# Altium footprint library ref-packages-longpad.PCBLIB: 1527 footprints (part 63 of 103)
Each footprint in its own frame and in the unit in brackets; x right, y up, seen from the top. Pads: shape width x height; smd on the part's side, far side on the other; paste and mask are expansions set on the pad; w line width, h text height; cw(c..) or ccw(c..) is an arc to the next point about the centre after c.
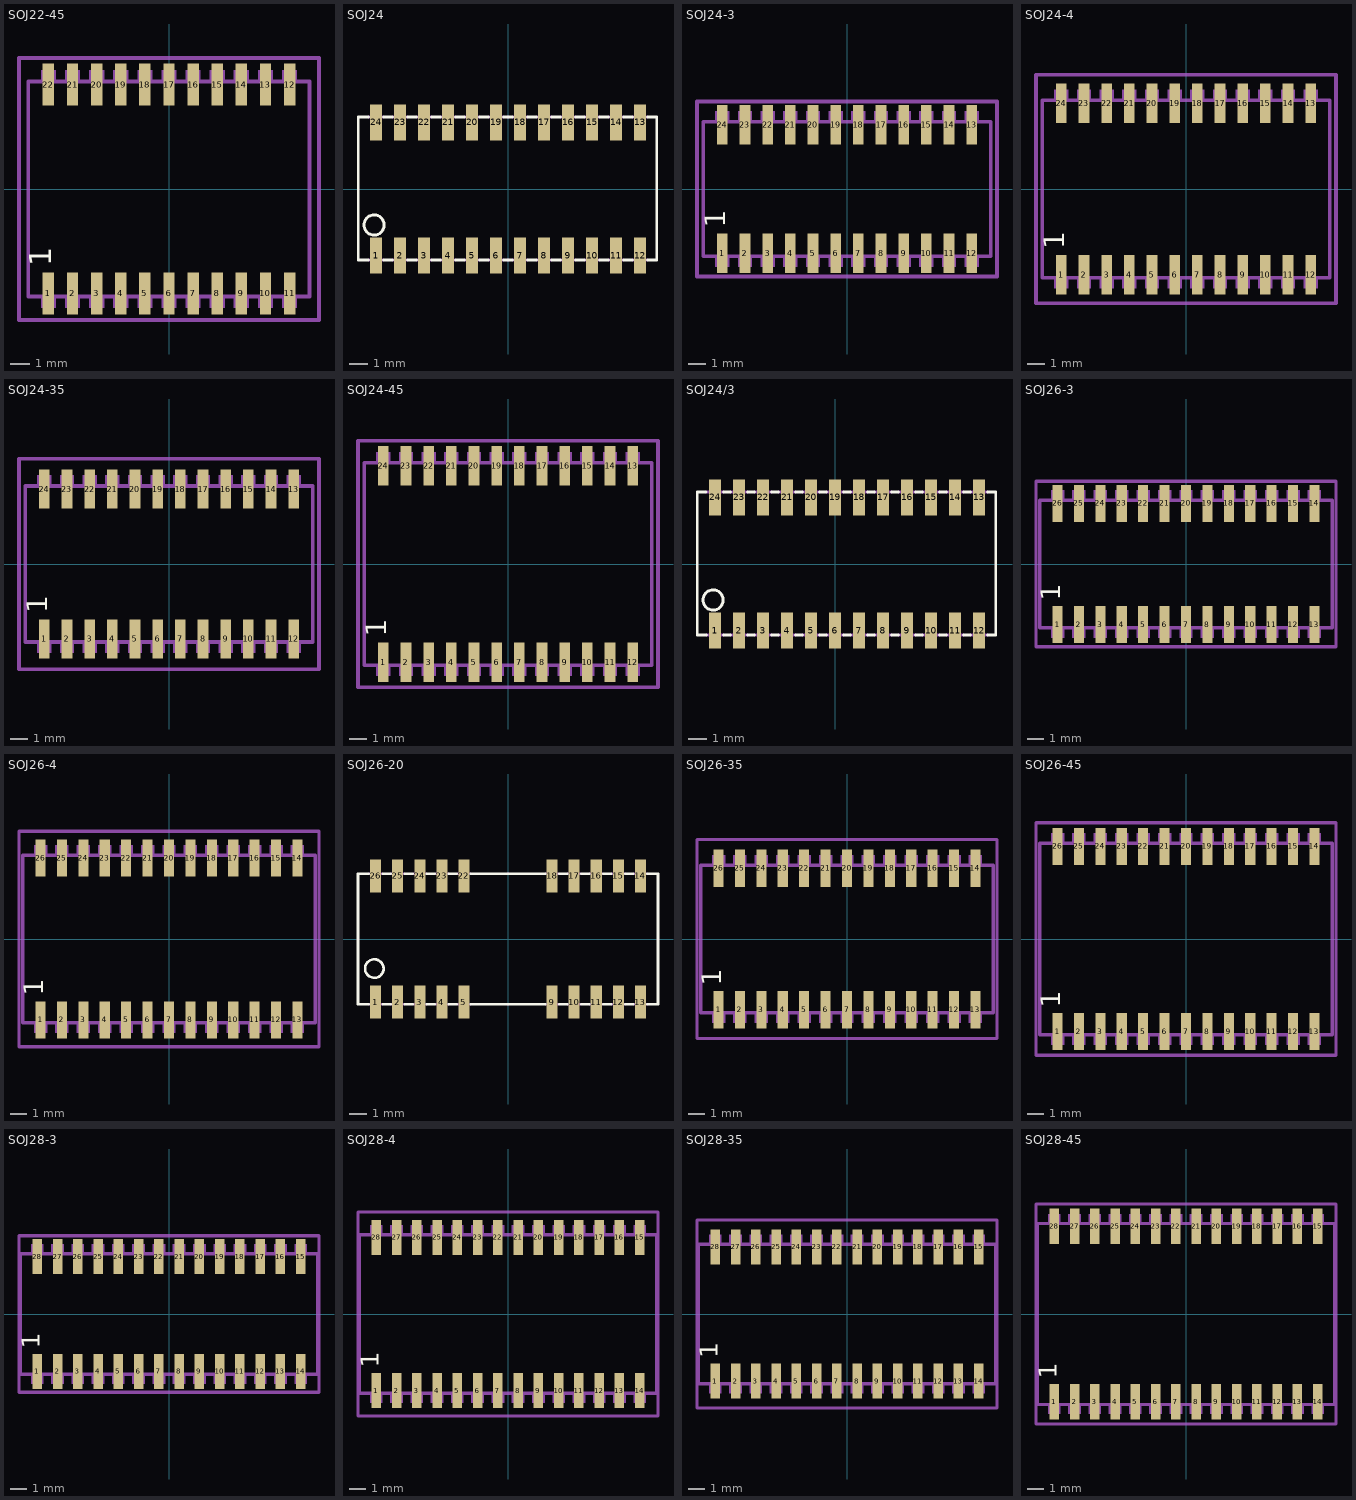
[diagram p62: the footprints below, top view; thin cyan lines are the x and y axes]

## SOJ22-45 [mil]
pads (22):
  rect 23.62x86.61 smd: 1(-250,-216.54) 2(-200,-216.54) 3(-150,-216.54) 4(-100,-216.54) 5(-50,-216.54) 6(0,-216.54) 7(50,-216.54) 8(100,-216.54) 9(150,-216.54) 10(200,-216.54) 11(250,-216.54) 12(250,216.54) 13(200,216.54) 14(150,216.54) 15(100,216.54) 16(50,216.54) 17(0,216.54) 18(-50,216.54) 19(-100,216.54) 20(-150,216.54) 21(-200,216.54) 22(-250,216.54)
Top Overlay:
  text "1" at -228.54,-160.24 h77.5
Mechanical 16:
  rectangle: -259.84,-219.29 -240.16,-174.41
  rectangle: -265.75,-247.24 -234.25,-227.17
  rectangle: -209.84,-219.29 -190.16,-174.41
  rectangle: -215.75,-247.24 -184.25,-227.17
  rectangle: -159.84,-219.29 -140.16,-174.41
  rectangle: -165.75,-247.24 -134.25,-227.17
  rectangle: -109.84,-219.29 -90.16,-174.41
  rectangle: -115.75,-247.24 -84.25,-227.17
  rectangle: -59.84,-219.29 -40.16,-174.41
  rectangle: -65.75,-247.24 -34.25,-227.17
  rectangle: -9.84,-219.29 9.84,-174.41
  rectangle: -15.75,-247.24 15.75,-227.17
  rectangle: 40.16,-219.29 59.84,-174.41
  rectangle: 34.25,-247.24 65.75,-227.17
  rectangle: 90.16,-219.29 109.84,-174.41
  rectangle: 84.25,-247.24 115.75,-227.17
  rectangle: 140.16,-219.29 159.84,-174.41
  rectangle: 134.25,-247.24 165.75,-227.17
  rectangle: 190.16,-219.29 209.84,-174.41
  rectangle: 184.25,-247.24 215.75,-227.17
  rectangle: 240.16,-219.29 259.84,-174.41
  rectangle: 234.25,-247.24 265.75,-227.17
  rectangle: 240.16,174.41 259.84,219.29
  rectangle: 234.25,227.17 265.75,247.24
  rectangle: 190.16,174.41 209.84,219.29
  rectangle: 184.25,227.17 215.75,247.24
  rectangle: 140.16,174.41 159.84,219.29
  rectangle: 134.25,227.17 165.75,247.24
  rectangle: 90.16,174.41 109.84,219.29
  rectangle: 84.25,227.17 115.75,247.24
  rectangle: 40.16,174.41 59.84,219.29
  rectangle: 34.25,227.17 65.75,247.24
  rectangle: -9.84,174.41 9.84,219.29
  rectangle: -15.75,227.17 15.75,247.24
  rectangle: -59.84,174.41 -40.16,219.29
  rectangle: -65.75,227.17 -34.25,247.24
  rectangle: -109.84,174.41 -90.16,219.29
  rectangle: -115.75,227.17 -84.25,247.24
  rectangle: -159.84,174.41 -140.16,219.29
  rectangle: -165.75,227.17 -134.25,247.24
  rectangle: -209.84,174.41 -190.16,219.29
  rectangle: -215.75,227.17 -184.25,247.24
  rectangle: -259.84,174.41 -240.16,219.29
  rectangle: -265.75,227.17 -234.25,247.24
  lines w8: -291.93,-223.23 291.54,-223.23 291.54,223.23 -291.93,223.23 -291.93,-223.23
Mechanical 27:
  lines w7.87: -311.02,-271.65 -311.02,271.65 311.02,271.65 311.02,-271.65 -311.02,-271.65

## SOJ24 [mil]
pads (24):
  rect 25x75 smd: 1(-275,-139) 2(-225,-139) 3(-175,-139) 4(-125,-139) 5(-75,-139) 6(-25,-139) 7(25,-139) 8(75,-139) 9(125,-139) 10(175,-139) 11(225,-139) 12(275,-139) 13(275,139) 14(225,139) 15(175,139) 16(125,139) 17(75,139) 18(25,139) 19(-25,139) 20(-75,139) 21(-125,139) 22(-175,139) 23(-225,139) 24(-275,139)
Top Overlay:
  circle w6: c-279,-75 r21
  lines w6: -291,-148 -312,-148 -312,150 -291,150 ; -259,-148 -241,-148 ; -259,150 -241,150 ; -209,-148 -191,-148 ; -209,150 -191,150 ; -159,-148 -141,-148 ; -159,150 -141,150 ; -109,-148 -91,-148 ; -109,150 -91,150 ; -59,-148 -41,-148 ; -59,150 -41,150 ; -9,-148 9,-148 ; -9,150 9,150 ; 41,-148 59,-148 ; 41,150 59,150 ; 91,-148 109,-148 ; 91,150 109,150 ; 141,-148 159,-148 ; 141,150 159,150 ; 191,-148 209,-148 ; 191,150 209,150 ; 241,-148 259,-148 ; 241,150 259,150 ; 291,-148 310,-148 310,150 291,150
Mechanical 16:
  rectangle: 265,152 285,172
  rectangle: 268,122 282,152
  rectangle: 215,152 235,172
  rectangle: 218,122 232,152
  rectangle: 165,152 185,172
  rectangle: 168,122 182,152
  rectangle: 115,152 135,172
  rectangle: 118,122 132,152
  rectangle: 65,152 85,172
  rectangle: 68,122 82,152
  rectangle: 15,152 35,172
  rectangle: 18,122 32,152
  rectangle: -35,152 -15,172
  rectangle: -32,122 -18,152
  rectangle: -85,152 -65,172
  rectangle: -82,122 -68,152
  rectangle: -135,152 -115,172
  rectangle: -132,122 -118,152
  rectangle: -185,152 -165,172
  rectangle: -182,122 -168,152
  rectangle: -235,152 -215,172
  rectangle: -232,122 -218,152
  rectangle: -285,152 -265,172
  rectangle: -282,122 -268,152
  rectangle: -285,-170 -265,-150
  rectangle: -282,-150 -268,-120
  rectangle: -235,-170 -215,-150
  rectangle: -232,-150 -218,-120
  rectangle: -185,-170 -165,-150
  rectangle: -182,-150 -168,-120
  rectangle: -135,-170 -115,-150
  rectangle: -132,-150 -118,-120
  rectangle: -85,-170 -65,-150
  rectangle: -82,-150 -68,-120
  rectangle: -35,-170 -15,-150
  rectangle: -32,-150 -18,-120
  rectangle: 15,-170 35,-150
  rectangle: 18,-150 32,-120
  rectangle: 65,-170 85,-150
  rectangle: 68,-150 82,-120
  rectangle: 115,-170 135,-150
  rectangle: 118,-150 132,-120
  rectangle: 165,-170 185,-150
  rectangle: 168,-150 182,-120
  rectangle: 215,-170 235,-150
  rectangle: 218,-150 232,-120
  rectangle: 265,-170 285,-150
  rectangle: 268,-150 282,-120
  lines w6: -290,150 -261,150 ; -289,-148 -261,-148 ; -239,-148 -211,-148 ; -239,150 -211,150 ; -189,-148 -161,-148 ; -189,150 -161,150 ; -139,-148 -111,-148 ; -139,150 -111,150 ; -89,-148 -61,-148 ; -89,150 -61,150 ; -39,-148 -11,-148 ; -39,150 -11,150 ; 11,-148 39,-148 ; 11,150 39,150 ; 61,-148 89,-148 ; 61,150 89,150 ; 111,-148 139,-148 ; 111,150 139,150 ; 161,-148 189,-148 ; 161,150 189,150 ; 211,-148 239,-148 ; 211,150 239,150 ; 261,-148 289,-148 ; 261,150 289,150

## SOJ24-3 [mil]
pads (24):
  rect 23.62x86.61 smd: 1(-275,-141.73) 2(-225,-141.73) 3(-175,-141.73) 4(-125,-141.73) 5(-75,-141.73) 6(-25,-141.73) 7(25,-141.73) 8(75,-141.73) 9(125,-141.73) 10(175,-141.73) 11(225,-141.73) 12(275,-141.73) 13(275,141.73) 14(225,141.73) 15(175,141.73) 16(125,141.73) 17(75,141.73) 18(25,141.73) 19(-25,141.73) 20(-75,141.73) 21(-125,141.73) 22(-175,141.73) 23(-225,141.73) 24(-275,141.73)
Top Overlay:
  text "1" at -253.54,-85.43 h77.5
Mechanical 16:
  rectangle: -284.84,-144.49 -265.16,-99.61
  rectangle: -290.75,-172.44 -259.25,-152.36
  rectangle: -234.84,-144.49 -215.16,-99.61
  rectangle: -240.75,-172.44 -209.25,-152.36
  rectangle: -184.84,-144.49 -165.16,-99.61
  rectangle: -190.75,-172.44 -159.25,-152.36
  rectangle: -134.84,-144.49 -115.16,-99.61
  rectangle: -140.75,-172.44 -109.25,-152.36
  rectangle: -84.84,-144.49 -65.16,-99.61
  rectangle: -90.75,-172.44 -59.25,-152.36
  rectangle: -34.84,-144.49 -15.16,-99.61
  rectangle: -40.75,-172.44 -9.25,-152.36
  rectangle: 15.16,-144.49 34.84,-99.61
  rectangle: 9.25,-172.44 40.75,-152.36
  rectangle: 65.16,-144.49 84.84,-99.61
  rectangle: 59.25,-172.44 90.75,-152.36
  rectangle: 115.16,-144.49 134.84,-99.61
  rectangle: 109.25,-172.44 140.75,-152.36
  rectangle: 165.16,-144.49 184.84,-99.61
  rectangle: 159.25,-172.44 190.75,-152.36
  rectangle: 215.16,-144.49 234.84,-99.61
  rectangle: 209.25,-172.44 240.75,-152.36
  rectangle: 265.16,-144.49 284.84,-99.61
  rectangle: 259.25,-172.44 290.75,-152.36
  rectangle: 265.16,99.61 284.84,144.49
  rectangle: 259.25,152.36 290.75,172.44
  rectangle: 215.16,99.61 234.84,144.49
  rectangle: 209.25,152.36 240.75,172.44
  rectangle: 165.16,99.61 184.84,144.49
  rectangle: 159.25,152.36 190.75,172.44
  rectangle: 115.16,99.61 134.84,144.49
  rectangle: 109.25,152.36 140.75,172.44
  rectangle: 65.16,99.61 84.84,144.49
  rectangle: 59.25,152.36 90.75,172.44
  rectangle: 15.16,99.61 34.84,144.49
  rectangle: 9.25,152.36 40.75,172.44
  rectangle: -34.84,99.61 -15.16,144.49
  rectangle: -40.75,152.36 -9.25,172.44
  rectangle: -84.84,99.61 -65.16,144.49
  rectangle: -90.75,152.36 -59.25,172.44
  rectangle: -134.84,99.61 -115.16,144.49
  rectangle: -140.75,152.36 -109.25,172.44
  rectangle: -184.84,99.61 -165.16,144.49
  rectangle: -190.75,152.36 -159.25,172.44
  rectangle: -234.84,99.61 -215.16,144.49
  rectangle: -240.75,152.36 -209.25,172.44
  rectangle: -284.84,99.61 -265.16,144.49
  rectangle: -290.75,152.36 -259.25,172.44
  lines w8: -316.93,-148.43 316.54,-148.43 316.54,148.43 -316.93,148.43 -316.93,-148.43
Mechanical 27:
  lines w7.87: -330.71,-192.91 -330.71,192.91 330.71,192.91 330.71,-192.91 -330.71,-192.91

## SOJ24-4 [mil]
pads (24):
  rect 23.62x86.61 smd: 1(-275,-188.98) 2(-225,-188.98) 3(-175,-188.98) 4(-125,-188.98) 5(-75,-188.98) 6(-25,-188.98) 7(25,-188.98) 8(75,-188.98) 9(125,-188.98) 10(175,-188.98) 11(225,-188.98) 12(275,-188.98) 13(275,188.98) 14(225,188.98) 15(175,188.98) 16(125,188.98) 17(75,188.98) 18(25,188.98) 19(-25,188.98) 20(-75,188.98) 21(-125,188.98) 22(-175,188.98) 23(-225,188.98) 24(-275,188.98)
Top Overlay:
  text "1" at -253.54,-132.68 h77.5
Mechanical 16:
  rectangle: -284.84,-191.73 -265.16,-146.85
  rectangle: -290.75,-219.69 -259.25,-199.61
  rectangle: -234.84,-191.73 -215.16,-146.85
  rectangle: -240.75,-219.69 -209.25,-199.61
  rectangle: -184.84,-191.73 -165.16,-146.85
  rectangle: -190.75,-219.69 -159.25,-199.61
  rectangle: -134.84,-191.73 -115.16,-146.85
  rectangle: -140.75,-219.69 -109.25,-199.61
  rectangle: -84.84,-191.73 -65.16,-146.85
  rectangle: -90.75,-219.69 -59.25,-199.61
  rectangle: -34.84,-191.73 -15.16,-146.85
  rectangle: -40.75,-219.69 -9.25,-199.61
  rectangle: 15.16,-191.73 34.84,-146.85
  rectangle: 9.25,-219.69 40.75,-199.61
  rectangle: 65.16,-191.73 84.84,-146.85
  rectangle: 59.25,-219.69 90.75,-199.61
  rectangle: 115.16,-191.73 134.84,-146.85
  rectangle: 109.25,-219.69 140.75,-199.61
  rectangle: 165.16,-191.73 184.84,-146.85
  rectangle: 159.25,-219.69 190.75,-199.61
  rectangle: 215.16,-191.73 234.84,-146.85
  rectangle: 209.25,-219.69 240.75,-199.61
  rectangle: 265.16,-191.73 284.84,-146.85
  rectangle: 259.25,-219.69 290.75,-199.61
  rectangle: 265.16,146.85 284.84,191.73
  rectangle: 259.25,199.61 290.75,219.69
  rectangle: 215.16,146.85 234.84,191.73
  rectangle: 209.25,199.61 240.75,219.69
  rectangle: 165.16,146.85 184.84,191.73
  rectangle: 159.25,199.61 190.75,219.69
  rectangle: 115.16,146.85 134.84,191.73
  rectangle: 109.25,199.61 140.75,219.69
  rectangle: 65.16,146.85 84.84,191.73
  rectangle: 59.25,199.61 90.75,219.69
  rectangle: 15.16,146.85 34.84,191.73
  rectangle: 9.25,199.61 40.75,219.69
  rectangle: -34.84,146.85 -15.16,191.73
  rectangle: -40.75,199.61 -9.25,219.69
  rectangle: -84.84,146.85 -65.16,191.73
  rectangle: -90.75,199.61 -59.25,219.69
  rectangle: -134.84,146.85 -115.16,191.73
  rectangle: -140.75,199.61 -109.25,219.69
  rectangle: -184.84,146.85 -165.16,191.73
  rectangle: -190.75,199.61 -159.25,219.69
  rectangle: -234.84,146.85 -215.16,191.73
  rectangle: -240.75,199.61 -209.25,219.69
  rectangle: -284.84,146.85 -265.16,191.73
  rectangle: -290.75,199.61 -259.25,219.69
  lines w8: -316.93,-195.67 316.54,-195.67 316.54,195.67 -316.93,195.67 -316.93,-195.67
Mechanical 27:
  lines w7.87: -330.71,-251.97 -330.71,251.97 330.71,251.97 330.71,-251.97 -330.71,-251.97

## SOJ24-35 [mil]
pads (24):
  rect 23.62x86.61 smd: 1(-275,-165.35) 2(-225,-165.35) 3(-175,-165.35) 4(-125,-165.35) 5(-75,-165.35) 6(-25,-165.35) 7(25,-165.35) 8(75,-165.35) 9(125,-165.35) 10(175,-165.35) 11(225,-165.35) 12(275,-165.35) 13(275,165.35) 14(225,165.35) 15(175,165.35) 16(125,165.35) 17(75,165.35) 18(25,165.35) 19(-25,165.35) 20(-75,165.35) 21(-125,165.35) 22(-175,165.35) 23(-225,165.35) 24(-275,165.35)
Top Overlay:
  text "1" at -253.54,-109.06 h77.5
Mechanical 16:
  rectangle: -284.84,-168.11 -265.16,-123.23
  rectangle: -290.75,-196.06 -259.25,-175.98
  rectangle: -234.84,-168.11 -215.16,-123.23
  rectangle: -240.75,-196.06 -209.25,-175.98
  rectangle: -184.84,-168.11 -165.16,-123.23
  rectangle: -190.75,-196.06 -159.25,-175.98
  rectangle: -134.84,-168.11 -115.16,-123.23
  rectangle: -140.75,-196.06 -109.25,-175.98
  rectangle: -84.84,-168.11 -65.16,-123.23
  rectangle: -90.75,-196.06 -59.25,-175.98
  rectangle: -34.84,-168.11 -15.16,-123.23
  rectangle: -40.75,-196.06 -9.25,-175.98
  rectangle: 15.16,-168.11 34.84,-123.23
  rectangle: 9.25,-196.06 40.75,-175.98
  rectangle: 65.16,-168.11 84.84,-123.23
  rectangle: 59.25,-196.06 90.75,-175.98
  rectangle: 115.16,-168.11 134.84,-123.23
  rectangle: 109.25,-196.06 140.75,-175.98
  rectangle: 165.16,-168.11 184.84,-123.23
  rectangle: 159.25,-196.06 190.75,-175.98
  rectangle: 215.16,-168.11 234.84,-123.23
  rectangle: 209.25,-196.06 240.75,-175.98
  rectangle: 265.16,-168.11 284.84,-123.23
  rectangle: 259.25,-196.06 290.75,-175.98
  rectangle: 265.16,123.23 284.84,168.11
  rectangle: 259.25,175.98 290.75,196.06
  rectangle: 215.16,123.23 234.84,168.11
  rectangle: 209.25,175.98 240.75,196.06
  rectangle: 165.16,123.23 184.84,168.11
  rectangle: 159.25,175.98 190.75,196.06
  rectangle: 115.16,123.23 134.84,168.11
  rectangle: 109.25,175.98 140.75,196.06
  rectangle: 65.16,123.23 84.84,168.11
  rectangle: 59.25,175.98 90.75,196.06
  rectangle: 15.16,123.23 34.84,168.11
  rectangle: 9.25,175.98 40.75,196.06
  rectangle: -34.84,123.23 -15.16,168.11
  rectangle: -40.75,175.98 -9.25,196.06
  rectangle: -84.84,123.23 -65.16,168.11
  rectangle: -90.75,175.98 -59.25,196.06
  rectangle: -134.84,123.23 -115.16,168.11
  rectangle: -140.75,175.98 -109.25,196.06
  rectangle: -184.84,123.23 -165.16,168.11
  rectangle: -190.75,175.98 -159.25,196.06
  rectangle: -234.84,123.23 -215.16,168.11
  rectangle: -240.75,175.98 -209.25,196.06
  rectangle: -284.84,123.23 -265.16,168.11
  rectangle: -290.75,175.98 -259.25,196.06
  lines w8: -316.93,-172.05 316.54,-172.05 316.54,172.05 -316.93,172.05 -316.93,-172.05
Mechanical 27:
  lines w7.87: -330.71,-232.28 -330.71,232.28 330.71,232.28 330.71,-232.28 -330.71,-232.28

## SOJ24-45 [mil]
pads (24):
  rect 23.62x86.61 smd: 1(-275,-216.54) 2(-225,-216.54) 3(-175,-216.54) 4(-125,-216.54) 5(-75,-216.54) 6(-25,-216.54) 7(25,-216.54) 8(75,-216.54) 9(125,-216.54) 10(175,-216.54) 11(225,-216.54) 12(275,-216.54) 13(275,216.54) 14(225,216.54) 15(175,216.54) 16(125,216.54) 17(75,216.54) 18(25,216.54) 19(-25,216.54) 20(-75,216.54) 21(-125,216.54) 22(-175,216.54) 23(-225,216.54) 24(-275,216.54)
Top Overlay:
  text "1" at -253.54,-160.24 h77.5
Mechanical 16:
  rectangle: -284.84,-219.29 -265.16,-174.41
  rectangle: -290.75,-247.24 -259.25,-227.17
  rectangle: -234.84,-219.29 -215.16,-174.41
  rectangle: -240.75,-247.24 -209.25,-227.17
  rectangle: -184.84,-219.29 -165.16,-174.41
  rectangle: -190.75,-247.24 -159.25,-227.17
  rectangle: -134.84,-219.29 -115.16,-174.41
  rectangle: -140.75,-247.24 -109.25,-227.17
  rectangle: -84.84,-219.29 -65.16,-174.41
  rectangle: -90.75,-247.24 -59.25,-227.17
  rectangle: -34.84,-219.29 -15.16,-174.41
  rectangle: -40.75,-247.24 -9.25,-227.17
  rectangle: 15.16,-219.29 34.84,-174.41
  rectangle: 9.25,-247.24 40.75,-227.17
  rectangle: 65.16,-219.29 84.84,-174.41
  rectangle: 59.25,-247.24 90.75,-227.17
  rectangle: 115.16,-219.29 134.84,-174.41
  rectangle: 109.25,-247.24 140.75,-227.17
  rectangle: 165.16,-219.29 184.84,-174.41
  rectangle: 159.25,-247.24 190.75,-227.17
  rectangle: 215.16,-219.29 234.84,-174.41
  rectangle: 209.25,-247.24 240.75,-227.17
  rectangle: 265.16,-219.29 284.84,-174.41
  rectangle: 259.25,-247.24 290.75,-227.17
  rectangle: 265.16,174.41 284.84,219.29
  rectangle: 259.25,227.17 290.75,247.24
  rectangle: 215.16,174.41 234.84,219.29
  rectangle: 209.25,227.17 240.75,247.24
  rectangle: 165.16,174.41 184.84,219.29
  rectangle: 159.25,227.17 190.75,247.24
  rectangle: 115.16,174.41 134.84,219.29
  rectangle: 109.25,227.17 140.75,247.24
  rectangle: 65.16,174.41 84.84,219.29
  rectangle: 59.25,227.17 90.75,247.24
  rectangle: 15.16,174.41 34.84,219.29
  rectangle: 9.25,227.17 40.75,247.24
  rectangle: -34.84,174.41 -15.16,219.29
  rectangle: -40.75,227.17 -9.25,247.24
  rectangle: -84.84,174.41 -65.16,219.29
  rectangle: -90.75,227.17 -59.25,247.24
  rectangle: -134.84,174.41 -115.16,219.29
  rectangle: -140.75,227.17 -109.25,247.24
  rectangle: -184.84,174.41 -165.16,219.29
  rectangle: -190.75,227.17 -159.25,247.24
  rectangle: -234.84,174.41 -215.16,219.29
  rectangle: -240.75,227.17 -209.25,247.24
  rectangle: -284.84,174.41 -265.16,219.29
  rectangle: -290.75,227.17 -259.25,247.24
  lines w8: -316.93,-223.23 316.54,-223.23 316.54,223.23 -316.93,223.23 -316.93,-223.23
Mechanical 27:
  lines w7.87: -330.71,-271.65 -330.71,271.65 330.71,271.65 330.71,-271.65 -330.71,-271.65

## SOJ24/3 [mil]
pads (24):
  rect 25x75 smd: 1(-250,-139) 2(-200,-139) 3(-150,-139) 4(-100,-139) 5(-50,-139) 6(0,-139) 7(50,-139) 8(100,-139) 9(150,-139) 10(200,-139) 11(250,-139) 12(300,-139) 13(300,139) 14(250,139) 15(200,139) 16(150,139) 17(100,139) 18(50,139) 19(0,139) 20(-50,139) 21(-100,139) 22(-150,139) 23(-200,139) 24(-250,139)
Top Overlay:
  circle w6: c-254,-75 r21
  lines w6: -269,150 -287,150 -287,-148 -268,-148 ; -232,-148 -218,-148 ; -232,150 -218,150 ; -182,-148 -168,-148 ; -182,150 -168,150 ; -132,-148 -118,-148 ; -132,150 -118,150 ; -82,-148 -68,-148 ; -82,150 -68,150 ; -32,-148 -18,-148 ; -32,150 -18,150 ; 18,-148 32,-148 ; 18,150 32,150 ; 68,-148 82,-148 ; 68,150 82,150 ; 118,-148 132,-148 ; 118,150 132,150 ; 168,-148 182,-148 ; 168,150 182,150 ; 218,-148 232,-148 ; 218,150 232,150 ; 268,-148 282,-148 ; 268,150 282,150 ; 318,-148 335,-148 335,150 318,150
Mechanical 16:
  rectangle: 290,152 310,172
  rectangle: 293,122 307,152
  rectangle: 240,152 260,172
  rectangle: 243,122 257,152
  rectangle: 190,152 210,172
  rectangle: 193,122 207,152
  rectangle: 140,152 160,172
  rectangle: 143,122 157,152
  rectangle: 90,152 110,172
  rectangle: 93,122 107,152
  rectangle: 40,152 60,172
  rectangle: 43,122 57,152
  rectangle: -10,152 10,172
  rectangle: -7,122 7,152
  rectangle: -60,152 -40,172
  rectangle: -57,122 -43,152
  rectangle: -110,152 -90,172
  rectangle: -107,122 -93,152
  rectangle: -160,152 -140,172
  rectangle: -157,122 -143,152
  rectangle: -210,152 -190,172
  rectangle: -207,122 -193,152
  rectangle: -260,152 -240,172
  rectangle: -257,122 -243,152
  rectangle: -260,-170 -240,-150
  rectangle: -257,-150 -243,-120
  rectangle: -210,-170 -190,-150
  rectangle: -207,-150 -193,-120
  rectangle: -160,-170 -140,-150
  rectangle: -157,-150 -143,-120
  rectangle: -110,-170 -90,-150
  rectangle: -107,-150 -93,-120
  rectangle: -60,-170 -40,-150
  rectangle: -57,-150 -43,-120
  rectangle: -10,-170 10,-150
  rectangle: -7,-150 7,-120
  rectangle: 40,-170 60,-150
  rectangle: 43,-150 57,-120
  rectangle: 90,-170 110,-150
  rectangle: 93,-150 107,-120
  rectangle: 140,-170 160,-150
  rectangle: 143,-150 157,-120
  rectangle: 190,-170 210,-150
  rectangle: 193,-150 207,-120
  rectangle: 240,-170 260,-150
  rectangle: 243,-150 257,-120
  rectangle: 290,-170 310,-150
  rectangle: 293,-150 307,-120
  lines w6: -269,150 -232,150 ; -268,-148 -232,-148 ; -218,-148 -182,-148 ; -218,150 -182,150 ; -168,-148 -132,-148 ; -168,150 -132,150 ; -118,-148 -82,-148 ; -118,150 -82,150 ; -68,-148 -32,-148 ; -68,150 -32,150 ; -18,-148 18,-148 ; -18,150 18,150 ; 32,-148 68,-148 ; 32,150 68,150 ; 82,-148 118,-148 ; 82,150 118,150 ; 132,-148 168,-148 ; 132,150 168,150 ; 182,-148 218,-148 ; 182,150 218,150 ; 232,-148 268,-148 ; 232,150 268,150 ; 282,-148 318,-148 ; 282,150 318,150

## SOJ26-3 [mil]
pads (26):
  rect 23.62x86.61 smd: 1(-300,-141.73) 2(-250,-141.73) 3(-200,-141.73) 4(-150,-141.73) 5(-100,-141.73) 6(-50,-141.73) 7(0,-141.73) 8(50,-141.73) 9(100,-141.73) 10(150,-141.73) 11(200,-141.73) 12(250,-141.73) 13(300,-141.73) 14(300,141.73) 15(250,141.73) 16(200,141.73) 17(150,141.73) 18(100,141.73) 19(50,141.73) 20(0,141.73) 21(-50,141.73) 22(-100,141.73) 23(-150,141.73) 24(-200,141.73) 25(-250,141.73) 26(-300,141.73)
Top Overlay:
  text "1" at -278.54,-85.43 h77.5
Mechanical 16:
  rectangle: -309.84,-144.49 -290.16,-99.61
  rectangle: -315.75,-172.44 -284.25,-152.36
  rectangle: -259.84,-144.49 -240.16,-99.61
  rectangle: -265.75,-172.44 -234.25,-152.36
  rectangle: -209.84,-144.49 -190.16,-99.61
  rectangle: -215.75,-172.44 -184.25,-152.36
  rectangle: -159.84,-144.49 -140.16,-99.61
  rectangle: -165.75,-172.44 -134.25,-152.36
  rectangle: -109.84,-144.49 -90.16,-99.61
  rectangle: -115.75,-172.44 -84.25,-152.36
  rectangle: -59.84,-144.49 -40.16,-99.61
  rectangle: -65.75,-172.44 -34.25,-152.36
  rectangle: -9.84,-144.49 9.84,-99.61
  rectangle: -15.75,-172.44 15.75,-152.36
  rectangle: 40.16,-144.49 59.84,-99.61
  rectangle: 34.25,-172.44 65.75,-152.36
  rectangle: 90.16,-144.49 109.84,-99.61
  rectangle: 84.25,-172.44 115.75,-152.36
  rectangle: 140.16,-144.49 159.84,-99.61
  rectangle: 134.25,-172.44 165.75,-152.36
  rectangle: 190.16,-144.49 209.84,-99.61
  rectangle: 184.25,-172.44 215.75,-152.36
  rectangle: 240.16,-144.49 259.84,-99.61
  rectangle: 234.25,-172.44 265.75,-152.36
  rectangle: 290.16,-144.49 309.84,-99.61
  rectangle: 284.25,-172.44 315.75,-152.36
  rectangle: 290.16,99.61 309.84,144.49
  rectangle: 284.25,152.36 315.75,172.44
  rectangle: 240.16,99.61 259.84,144.49
  rectangle: 234.25,152.36 265.75,172.44
  rectangle: 190.16,99.61 209.84,144.49
  rectangle: 184.25,152.36 215.75,172.44
  rectangle: 140.16,99.61 159.84,144.49
  rectangle: 134.25,152.36 165.75,172.44
  rectangle: 90.16,99.61 109.84,144.49
  rectangle: 84.25,152.36 115.75,172.44
  rectangle: 40.16,99.61 59.84,144.49
  rectangle: 34.25,152.36 65.75,172.44
  rectangle: -9.84,99.61 9.84,144.49
  rectangle: -15.75,152.36 15.75,172.44
  rectangle: -59.84,99.61 -40.16,144.49
  rectangle: -65.75,152.36 -34.25,172.44
  rectangle: -109.84,99.61 -90.16,144.49
  rectangle: -115.75,152.36 -84.25,172.44
  rectangle: -159.84,99.61 -140.16,144.49
  rectangle: -165.75,152.36 -134.25,172.44
  rectangle: -209.84,99.61 -190.16,144.49
  rectangle: -215.75,152.36 -184.25,172.44
  rectangle: -259.84,99.61 -240.16,144.49
  rectangle: -265.75,152.36 -234.25,172.44
  rectangle: -309.84,99.61 -290.16,144.49
  rectangle: -315.75,152.36 -284.25,172.44
  lines w8: -341.93,-148.43 341.54,-148.43 341.54,148.43 -341.93,148.43 -341.93,-148.43
Mechanical 27:
  lines w7.87: -350.39,-192.91 -350.39,192.91 350.39,192.91 350.39,-192.91 -350.39,-192.91

## SOJ26-4 [mil]
pads (26):
  rect 23.62x86.61 smd: 1(-300,-188.98) 2(-250,-188.98) 3(-200,-188.98) 4(-150,-188.98) 5(-100,-188.98) 6(-50,-188.98) 7(0,-188.98) 8(50,-188.98) 9(100,-188.98) 10(150,-188.98) 11(200,-188.98) 12(250,-188.98) 13(300,-188.98) 14(300,188.98) 15(250,188.98) 16(200,188.98) 17(150,188.98) 18(100,188.98) 19(50,188.98) 20(0,188.98) 21(-50,188.98) 22(-100,188.98) 23(-150,188.98) 24(-200,188.98) 25(-250,188.98) 26(-300,188.98)
Top Overlay:
  text "1" at -278.54,-132.68 h77.5
Mechanical 16:
  rectangle: -309.84,-191.73 -290.16,-146.85
  rectangle: -315.75,-219.69 -284.25,-199.61
  rectangle: -259.84,-191.73 -240.16,-146.85
  rectangle: -265.75,-219.69 -234.25,-199.61
  rectangle: -209.84,-191.73 -190.16,-146.85
  rectangle: -215.75,-219.69 -184.25,-199.61
  rectangle: -159.84,-191.73 -140.16,-146.85
  rectangle: -165.75,-219.69 -134.25,-199.61
  rectangle: -109.84,-191.73 -90.16,-146.85
  rectangle: -115.75,-219.69 -84.25,-199.61
  rectangle: -59.84,-191.73 -40.16,-146.85
  rectangle: -65.75,-219.69 -34.25,-199.61
  rectangle: -9.84,-191.73 9.84,-146.85
  rectangle: -15.75,-219.69 15.75,-199.61
  rectangle: 40.16,-191.73 59.84,-146.85
  rectangle: 34.25,-219.69 65.75,-199.61
  rectangle: 90.16,-191.73 109.84,-146.85
  rectangle: 84.25,-219.69 115.75,-199.61
  rectangle: 140.16,-191.73 159.84,-146.85
  rectangle: 134.25,-219.69 165.75,-199.61
  rectangle: 190.16,-191.73 209.84,-146.85
  rectangle: 184.25,-219.69 215.75,-199.61
  rectangle: 240.16,-191.73 259.84,-146.85
  rectangle: 234.25,-219.69 265.75,-199.61
  rectangle: 290.16,-191.73 309.84,-146.85
  rectangle: 284.25,-219.69 315.75,-199.61
  rectangle: 290.16,146.85 309.84,191.73
  rectangle: 284.25,199.61 315.75,219.69
  rectangle: 240.16,146.85 259.84,191.73
  rectangle: 234.25,199.61 265.75,219.69
  rectangle: 190.16,146.85 209.84,191.73
  rectangle: 184.25,199.61 215.75,219.69
  rectangle: 140.16,146.85 159.84,191.73
  rectangle: 134.25,199.61 165.75,219.69
  rectangle: 90.16,146.85 109.84,191.73
  rectangle: 84.25,199.61 115.75,219.69
  rectangle: 40.16,146.85 59.84,191.73
  rectangle: 34.25,199.61 65.75,219.69
  rectangle: -9.84,146.85 9.84,191.73
  rectangle: -15.75,199.61 15.75,219.69
  rectangle: -59.84,146.85 -40.16,191.73
  rectangle: -65.75,199.61 -34.25,219.69
  rectangle: -109.84,146.85 -90.16,191.73
  rectangle: -115.75,199.61 -84.25,219.69
  rectangle: -159.84,146.85 -140.16,191.73
  rectangle: -165.75,199.61 -134.25,219.69
  rectangle: -209.84,146.85 -190.16,191.73
  rectangle: -215.75,199.61 -184.25,219.69
  rectangle: -259.84,146.85 -240.16,191.73
  rectangle: -265.75,199.61 -234.25,219.69
  rectangle: -309.84,146.85 -290.16,191.73
  rectangle: -315.75,199.61 -284.25,219.69
  lines w8: -341.93,-195.67 341.54,-195.67 341.54,195.67 -341.93,195.67 -341.93,-195.67
Mechanical 27:
  lines w7.87: -350.39,-251.97 -350.39,251.97 350.39,251.97 350.39,-251.97 -350.39,-251.97

## SOJ26-20 [mil]
pads (20):
  rect 25x75 smd: 1(-300,-143) 2(-250,-143) 3(-200,-143) 4(-150,-143) 5(-100,-143) 9(100,-143) 10(150,-143) 11(200,-143) 12(250,-143) 13(300,-143) 14(300,143) 15(250,143) 16(200,143) 17(150,143) 18(100,143) 22(-100,143) 23(-150,143) 24(-200,143) 25(-250,143) 26(-300,143)
Top Overlay:
  circle w6: c-303,-67 r21
  lines w6: -316,-148 -340,-148 -340,148 -316,148 ; -284,-148 -266,-148 ; -284,148 -266,148 ; -234,-148 -216,-148 ; -234,148 -216,148 ; -184,-148 -166,-148 ; -184,148 -166,148 ; -134,-148 -116,-148 ; -134,148 -116,148 ; -84,-148 84,-148 ; -84,148 84,148 ; 116,-148 134,-148 ; 116,148 134,148 ; 166,-148 184,-148 ; 166,148 184,148 ; 216,-148 234,-148 ; 216,148 234,148 ; 266,-148 284,-148 ; 266,148 284,148 ; 316,-148 340,-148 340,148 316,148
Mechanical 16:
  rectangle: 290,150 310,170
  rectangle: 293,120 307,150
  rectangle: 290,-170 310,-150
  rectangle: 293,-150 307,-120
  rectangle: 240,150 260,170
  rectangle: 243,120 257,150
  rectangle: 190,150 210,170
  rectangle: 193,120 207,150
  rectangle: 140,150 160,170
  rectangle: 143,120 157,150
  rectangle: 90,150 110,170
  rectangle: 93,120 107,150
  rectangle: -110,150 -90,170
  rectangle: -107,120 -93,150
  rectangle: -160,150 -140,170
  rectangle: -157,120 -143,150
  rectangle: -210,150 -190,170
  rectangle: -207,120 -193,150
  rectangle: -260,150 -240,170
  rectangle: -257,120 -243,150
  rectangle: -310,150 -290,170
  rectangle: -307,120 -293,150
  rectangle: -310,-170 -290,-150
  rectangle: -307,-150 -293,-120
  rectangle: -260,-170 -240,-150
  rectangle: -257,-150 -243,-120
  rectangle: -210,-170 -190,-150
  rectangle: -207,-150 -193,-120
  rectangle: -160,-170 -140,-150
  rectangle: -157,-150 -143,-120
  rectangle: -110,-170 -90,-150
  rectangle: -107,-150 -93,-120
  rectangle: 90,-170 110,-150
  rectangle: 93,-150 107,-120
  rectangle: 140,-170 160,-150
  rectangle: 143,-150 157,-120
  rectangle: 190,-170 210,-150
  rectangle: 193,-150 207,-120
  rectangle: 240,-170 260,-150
  rectangle: 243,-150 257,-120
  lines w6: -314,-148 -286,-148 ; -314,148 -286,148 ; -264,-148 -236,-148 ; -264,148 -236,148 ; -214,-148 -186,-148 ; -214,148 -186,148 ; -164,-148 -136,-148 ; -164,148 -136,148 ; -114,-148 -86,-148 ; -114,148 -86,148 ; 86,-148 114,-148 ; 86,148 114,148 ; 136,-148 164,-148 ; 136,148 164,148 ; 186,-148 214,-148 ; 186,148 214,148 ; 236,-148 264,-148 ; 236,148 264,148 ; 286,-148 314,-148 ; 286,148 314,148

## SOJ26-35 [mil]
pads (26):
  rect 23.62x86.61 smd: 1(-300,-165.35) 2(-250,-165.35) 3(-200,-165.35) 4(-150,-165.35) 5(-100,-165.35) 6(-50,-165.35) 7(0,-165.35) 8(50,-165.35) 9(100,-165.35) 10(150,-165.35) 11(200,-165.35) 12(250,-165.35) 13(300,-165.35) 14(300,165.35) 15(250,165.35) 16(200,165.35) 17(150,165.35) 18(100,165.35) 19(50,165.35) 20(0,165.35) 21(-50,165.35) 22(-100,165.35) 23(-150,165.35) 24(-200,165.35) 25(-250,165.35) 26(-300,165.35)
Top Overlay:
  text "1" at -278.54,-109.06 h77.5
Mechanical 16:
  rectangle: -309.84,-168.11 -290.16,-123.23
  rectangle: -315.75,-196.06 -284.25,-175.98
  rectangle: -259.84,-168.11 -240.16,-123.23
  rectangle: -265.75,-196.06 -234.25,-175.98
  rectangle: -209.84,-168.11 -190.16,-123.23
  rectangle: -215.75,-196.06 -184.25,-175.98
  rectangle: -159.84,-168.11 -140.16,-123.23
  rectangle: -165.75,-196.06 -134.25,-175.98
  rectangle: -109.84,-168.11 -90.16,-123.23
  rectangle: -115.75,-196.06 -84.25,-175.98
  rectangle: -59.84,-168.11 -40.16,-123.23
  rectangle: -65.75,-196.06 -34.25,-175.98
  rectangle: -9.84,-168.11 9.84,-123.23
  rectangle: -15.75,-196.06 15.75,-175.98
  rectangle: 40.16,-168.11 59.84,-123.23
  rectangle: 34.25,-196.06 65.75,-175.98
  rectangle: 90.16,-168.11 109.84,-123.23
  rectangle: 84.25,-196.06 115.75,-175.98
  rectangle: 140.16,-168.11 159.84,-123.23
  rectangle: 134.25,-196.06 165.75,-175.98
  rectangle: 190.16,-168.11 209.84,-123.23
  rectangle: 184.25,-196.06 215.75,-175.98
  rectangle: 240.16,-168.11 259.84,-123.23
  rectangle: 234.25,-196.06 265.75,-175.98
  rectangle: 290.16,-168.11 309.84,-123.23
  rectangle: 284.25,-196.06 315.75,-175.98
  rectangle: 290.16,123.23 309.84,168.11
  rectangle: 284.25,175.98 315.75,196.06
  rectangle: 240.16,123.23 259.84,168.11
  rectangle: 234.25,175.98 265.75,196.06
  rectangle: 190.16,123.23 209.84,168.11
  rectangle: 184.25,175.98 215.75,196.06
  rectangle: 140.16,123.23 159.84,168.11
  rectangle: 134.25,175.98 165.75,196.06
  rectangle: 90.16,123.23 109.84,168.11
  rectangle: 84.25,175.98 115.75,196.06
  rectangle: 40.16,123.23 59.84,168.11
  rectangle: 34.25,175.98 65.75,196.06
  rectangle: -9.84,123.23 9.84,168.11
  rectangle: -15.75,175.98 15.75,196.06
  rectangle: -59.84,123.23 -40.16,168.11
  rectangle: -65.75,175.98 -34.25,196.06
  rectangle: -109.84,123.23 -90.16,168.11
  rectangle: -115.75,175.98 -84.25,196.06
  rectangle: -159.84,123.23 -140.16,168.11
  rectangle: -165.75,175.98 -134.25,196.06
  rectangle: -209.84,123.23 -190.16,168.11
  rectangle: -215.75,175.98 -184.25,196.06
  rectangle: -259.84,123.23 -240.16,168.11
  rectangle: -265.75,175.98 -234.25,196.06
  rectangle: -309.84,123.23 -290.16,168.11
  rectangle: -315.75,175.98 -284.25,196.06
  lines w8: -341.93,-172.05 341.54,-172.05 341.54,172.05 -341.93,172.05 -341.93,-172.05
Mechanical 27:
  lines w7.87: -350.39,-232.28 -350.39,232.28 350.39,232.28 350.39,-232.28 -350.39,-232.28

## SOJ26-45 [mil]
pads (26):
  rect 23.62x86.61 smd: 1(-300,-216.54) 2(-250,-216.54) 3(-200,-216.54) 4(-150,-216.54) 5(-100,-216.54) 6(-50,-216.54) 7(0,-216.54) 8(50,-216.54) 9(100,-216.54) 10(150,-216.54) 11(200,-216.54) 12(250,-216.54) 13(300,-216.54) 14(300,216.54) 15(250,216.54) 16(200,216.54) 17(150,216.54) 18(100,216.54) 19(50,216.54) 20(0,216.54) 21(-50,216.54) 22(-100,216.54) 23(-150,216.54) 24(-200,216.54) 25(-250,216.54) 26(-300,216.54)
Top Overlay:
  text "1" at -278.54,-160.24 h77.5
Mechanical 16:
  rectangle: -309.84,-219.29 -290.16,-174.41
  rectangle: -315.75,-247.24 -284.25,-227.17
  rectangle: -259.84,-219.29 -240.16,-174.41
  rectangle: -265.75,-247.24 -234.25,-227.17
  rectangle: -209.84,-219.29 -190.16,-174.41
  rectangle: -215.75,-247.24 -184.25,-227.17
  rectangle: -159.84,-219.29 -140.16,-174.41
  rectangle: -165.75,-247.24 -134.25,-227.17
  rectangle: -109.84,-219.29 -90.16,-174.41
  rectangle: -115.75,-247.24 -84.25,-227.17
  rectangle: -59.84,-219.29 -40.16,-174.41
  rectangle: -65.75,-247.24 -34.25,-227.17
  rectangle: -9.84,-219.29 9.84,-174.41
  rectangle: -15.75,-247.24 15.75,-227.17
  rectangle: 40.16,-219.29 59.84,-174.41
  rectangle: 34.25,-247.24 65.75,-227.17
  rectangle: 90.16,-219.29 109.84,-174.41
  rectangle: 84.25,-247.24 115.75,-227.17
  rectangle: 140.16,-219.29 159.84,-174.41
  rectangle: 134.25,-247.24 165.75,-227.17
  rectangle: 190.16,-219.29 209.84,-174.41
  rectangle: 184.25,-247.24 215.75,-227.17
  rectangle: 240.16,-219.29 259.84,-174.41
  rectangle: 234.25,-247.24 265.75,-227.17
  rectangle: 290.16,-219.29 309.84,-174.41
  rectangle: 284.25,-247.24 315.75,-227.17
  rectangle: 290.16,174.41 309.84,219.29
  rectangle: 284.25,227.17 315.75,247.24
  rectangle: 240.16,174.41 259.84,219.29
  rectangle: 234.25,227.17 265.75,247.24
  rectangle: 190.16,174.41 209.84,219.29
  rectangle: 184.25,227.17 215.75,247.24
  rectangle: 140.16,174.41 159.84,219.29
  rectangle: 134.25,227.17 165.75,247.24
  rectangle: 90.16,174.41 109.84,219.29
  rectangle: 84.25,227.17 115.75,247.24
  rectangle: 40.16,174.41 59.84,219.29
  rectangle: 34.25,227.17 65.75,247.24
  rectangle: -9.84,174.41 9.84,219.29
  rectangle: -15.75,227.17 15.75,247.24
  rectangle: -59.84,174.41 -40.16,219.29
  rectangle: -65.75,227.17 -34.25,247.24
  rectangle: -109.84,174.41 -90.16,219.29
  rectangle: -115.75,227.17 -84.25,247.24
  rectangle: -159.84,174.41 -140.16,219.29
  rectangle: -165.75,227.17 -134.25,247.24
  rectangle: -209.84,174.41 -190.16,219.29
  rectangle: -215.75,227.17 -184.25,247.24
  rectangle: -259.84,174.41 -240.16,219.29
  rectangle: -265.75,227.17 -234.25,247.24
  rectangle: -309.84,174.41 -290.16,219.29
  rectangle: -315.75,227.17 -284.25,247.24
  lines w8: -341.93,-223.23 341.54,-223.23 341.54,223.23 -341.93,223.23 -341.93,-223.23
Mechanical 27:
  lines w7.87: -350.39,-271.65 -350.39,271.65 350.39,271.65 350.39,-271.65 -350.39,-271.65

## SOJ28-3 [mil]
pads (28):
  rect 23.62x86.61 smd: 1(-325,-141.73) 2(-275,-141.73) 3(-225,-141.73) 4(-175,-141.73) 5(-125,-141.73) 6(-75,-141.73) 7(-25,-141.73) 8(25,-141.73) 9(75,-141.73) 10(125,-141.73) 11(175,-141.73) 12(225,-141.73) 13(275,-141.73) 14(325,-141.73) 15(325,141.73) 16(275,141.73) 17(225,141.73) 18(175,141.73) 19(125,141.73) 20(75,141.73) 21(25,141.73) 22(-25,141.73) 23(-75,141.73) 24(-125,141.73) 25(-175,141.73) 26(-225,141.73) 27(-275,141.73) 28(-325,141.73)
Top Overlay:
  text "1" at -303.54,-85.43 h77.5
Mechanical 16:
  rectangle: -334.84,-144.49 -315.16,-99.61
  rectangle: -340.75,-172.44 -309.25,-152.36
  rectangle: -284.84,-144.49 -265.16,-99.61
  rectangle: -290.75,-172.44 -259.25,-152.36
  rectangle: -234.84,-144.49 -215.16,-99.61
  rectangle: -240.75,-172.44 -209.25,-152.36
  rectangle: -184.84,-144.49 -165.16,-99.61
  rectangle: -190.75,-172.44 -159.25,-152.36
  rectangle: -134.84,-144.49 -115.16,-99.61
  rectangle: -140.75,-172.44 -109.25,-152.36
  rectangle: -84.84,-144.49 -65.16,-99.61
  rectangle: -90.75,-172.44 -59.25,-152.36
  rectangle: -34.84,-144.49 -15.16,-99.61
  rectangle: -40.75,-172.44 -9.25,-152.36
  rectangle: 15.16,-144.49 34.84,-99.61
  rectangle: 9.25,-172.44 40.75,-152.36
  rectangle: 65.16,-144.49 84.84,-99.61
  rectangle: 59.25,-172.44 90.75,-152.36
  rectangle: 115.16,-144.49 134.84,-99.61
  rectangle: 109.25,-172.44 140.75,-152.36
  rectangle: 165.16,-144.49 184.84,-99.61
  rectangle: 159.25,-172.44 190.75,-152.36
  rectangle: 215.16,-144.49 234.84,-99.61
  rectangle: 209.25,-172.44 240.75,-152.36
  rectangle: 265.16,-144.49 284.84,-99.61
  rectangle: 259.25,-172.44 290.75,-152.36
  rectangle: 315.16,-144.49 334.84,-99.61
  rectangle: 309.25,-172.44 340.75,-152.36
  rectangle: 315.16,99.61 334.84,144.49
  rectangle: 309.25,152.36 340.75,172.44
  rectangle: 265.16,99.61 284.84,144.49
  rectangle: 259.25,152.36 290.75,172.44
  rectangle: 215.16,99.61 234.84,144.49
  rectangle: 209.25,152.36 240.75,172.44
  rectangle: 165.16,99.61 184.84,144.49
  rectangle: 159.25,152.36 190.75,172.44
  rectangle: 115.16,99.61 134.84,144.49
  rectangle: 109.25,152.36 140.75,172.44
  rectangle: 65.16,99.61 84.84,144.49
  rectangle: 59.25,152.36 90.75,172.44
  rectangle: 15.16,99.61 34.84,144.49
  rectangle: 9.25,152.36 40.75,172.44
  rectangle: -34.84,99.61 -15.16,144.49
  rectangle: -40.75,152.36 -9.25,172.44
  rectangle: -84.84,99.61 -65.16,144.49
  rectangle: -90.75,152.36 -59.25,172.44
  rectangle: -134.84,99.61 -115.16,144.49
  rectangle: -140.75,152.36 -109.25,172.44
  rectangle: -184.84,99.61 -165.16,144.49
  rectangle: -190.75,152.36 -159.25,172.44
  rectangle: -234.84,99.61 -215.16,144.49
  rectangle: -240.75,152.36 -209.25,172.44
  rectangle: -284.84,99.61 -265.16,144.49
  rectangle: -290.75,152.36 -259.25,172.44
  rectangle: -334.84,99.61 -315.16,144.49
  rectangle: -340.75,152.36 -309.25,172.44
  lines w8: -366.93,-148.43 366.54,-148.43 366.54,148.43 -366.93,148.43 -366.93,-148.43
Mechanical 27:
  lines w7.87: -370.08,-192.91 -370.08,192.91 370.08,192.91 370.08,-192.91 -370.08,-192.91

## SOJ28-4 [mil]
pads (28):
  rect 23.62x86.61 smd: 1(-325,-188.98) 2(-275,-188.98) 3(-225,-188.98) 4(-175,-188.98) 5(-125,-188.98) 6(-75,-188.98) 7(-25,-188.98) 8(25,-188.98) 9(75,-188.98) 10(125,-188.98) 11(175,-188.98) 12(225,-188.98) 13(275,-188.98) 14(325,-188.98) 15(325,188.98) 16(275,188.98) 17(225,188.98) 18(175,188.98) 19(125,188.98) 20(75,188.98) 21(25,188.98) 22(-25,188.98) 23(-75,188.98) 24(-125,188.98) 25(-175,188.98) 26(-225,188.98) 27(-275,188.98) 28(-325,188.98)
Top Overlay:
  text "1" at -303.54,-132.68 h77.5
Mechanical 16:
  rectangle: -334.84,-191.73 -315.16,-146.85
  rectangle: -340.75,-219.69 -309.25,-199.61
  rectangle: -284.84,-191.73 -265.16,-146.85
  rectangle: -290.75,-219.69 -259.25,-199.61
  rectangle: -234.84,-191.73 -215.16,-146.85
  rectangle: -240.75,-219.69 -209.25,-199.61
  rectangle: -184.84,-191.73 -165.16,-146.85
  rectangle: -190.75,-219.69 -159.25,-199.61
  rectangle: -134.84,-191.73 -115.16,-146.85
  rectangle: -140.75,-219.69 -109.25,-199.61
  rectangle: -84.84,-191.73 -65.16,-146.85
  rectangle: -90.75,-219.69 -59.25,-199.61
  rectangle: -34.84,-191.73 -15.16,-146.85
  rectangle: -40.75,-219.69 -9.25,-199.61
  rectangle: 15.16,-191.73 34.84,-146.85
  rectangle: 9.25,-219.69 40.75,-199.61
  rectangle: 65.16,-191.73 84.84,-146.85
  rectangle: 59.25,-219.69 90.75,-199.61
  rectangle: 115.16,-191.73 134.84,-146.85
  rectangle: 109.25,-219.69 140.75,-199.61
  rectangle: 165.16,-191.73 184.84,-146.85
  rectangle: 159.25,-219.69 190.75,-199.61
  rectangle: 215.16,-191.73 234.84,-146.85
  rectangle: 209.25,-219.69 240.75,-199.61
  rectangle: 265.16,-191.73 284.84,-146.85
  rectangle: 259.25,-219.69 290.75,-199.61
  rectangle: 315.16,-191.73 334.84,-146.85
  rectangle: 309.25,-219.69 340.75,-199.61
  rectangle: 315.16,146.85 334.84,191.73
  rectangle: 309.25,199.61 340.75,219.69
  rectangle: 265.16,146.85 284.84,191.73
  rectangle: 259.25,199.61 290.75,219.69
  rectangle: 215.16,146.85 234.84,191.73
  rectangle: 209.25,199.61 240.75,219.69
  rectangle: 165.16,146.85 184.84,191.73
  rectangle: 159.25,199.61 190.75,219.69
  rectangle: 115.16,146.85 134.84,191.73
  rectangle: 109.25,199.61 140.75,219.69
  rectangle: 65.16,146.85 84.84,191.73
  rectangle: 59.25,199.61 90.75,219.69
  rectangle: 15.16,146.85 34.84,191.73
  rectangle: 9.25,199.61 40.75,219.69
  rectangle: -34.84,146.85 -15.16,191.73
  rectangle: -40.75,199.61 -9.25,219.69
  rectangle: -84.84,146.85 -65.16,191.73
  rectangle: -90.75,199.61 -59.25,219.69
  rectangle: -134.84,146.85 -115.16,191.73
  rectangle: -140.75,199.61 -109.25,219.69
  rectangle: -184.84,146.85 -165.16,191.73
  rectangle: -190.75,199.61 -159.25,219.69
  rectangle: -234.84,146.85 -215.16,191.73
  rectangle: -240.75,199.61 -209.25,219.69
  rectangle: -284.84,146.85 -265.16,191.73
  rectangle: -290.75,199.61 -259.25,219.69
  rectangle: -334.84,146.85 -315.16,191.73
  rectangle: -340.75,199.61 -309.25,219.69
  lines w8: -366.93,-195.67 366.54,-195.67 366.54,195.67 -366.93,195.67 -366.93,-195.67
Mechanical 27:
  lines w7.87: -370.08,-251.97 -370.08,251.97 370.08,251.97 370.08,-251.97 -370.08,-251.97

## SOJ28-35 [mil]
pads (28):
  rect 23.62x86.61 smd: 1(-325,-165.35) 2(-275,-165.35) 3(-225,-165.35) 4(-175,-165.35) 5(-125,-165.35) 6(-75,-165.35) 7(-25,-165.35) 8(25,-165.35) 9(75,-165.35) 10(125,-165.35) 11(175,-165.35) 12(225,-165.35) 13(275,-165.35) 14(325,-165.35) 15(325,165.35) 16(275,165.35) 17(225,165.35) 18(175,165.35) 19(125,165.35) 20(75,165.35) 21(25,165.35) 22(-25,165.35) 23(-75,165.35) 24(-125,165.35) 25(-175,165.35) 26(-225,165.35) 27(-275,165.35) 28(-325,165.35)
Top Overlay:
  text "1" at -303.54,-109.06 h77.5
Mechanical 16:
  rectangle: -334.84,-168.11 -315.16,-123.23
  rectangle: -340.75,-196.06 -309.25,-175.98
  rectangle: -284.84,-168.11 -265.16,-123.23
  rectangle: -290.75,-196.06 -259.25,-175.98
  rectangle: -234.84,-168.11 -215.16,-123.23
  rectangle: -240.75,-196.06 -209.25,-175.98
  rectangle: -184.84,-168.11 -165.16,-123.23
  rectangle: -190.75,-196.06 -159.25,-175.98
  rectangle: -134.84,-168.11 -115.16,-123.23
  rectangle: -140.75,-196.06 -109.25,-175.98
  rectangle: -84.84,-168.11 -65.16,-123.23
  rectangle: -90.75,-196.06 -59.25,-175.98
  rectangle: -34.84,-168.11 -15.16,-123.23
  rectangle: -40.75,-196.06 -9.25,-175.98
  rectangle: 15.16,-168.11 34.84,-123.23
  rectangle: 9.25,-196.06 40.75,-175.98
  rectangle: 65.16,-168.11 84.84,-123.23
  rectangle: 59.25,-196.06 90.75,-175.98
  rectangle: 115.16,-168.11 134.84,-123.23
  rectangle: 109.25,-196.06 140.75,-175.98
  rectangle: 165.16,-168.11 184.84,-123.23
  rectangle: 159.25,-196.06 190.75,-175.98
  rectangle: 215.16,-168.11 234.84,-123.23
  rectangle: 209.25,-196.06 240.75,-175.98
  rectangle: 265.16,-168.11 284.84,-123.23
  rectangle: 259.25,-196.06 290.75,-175.98
  rectangle: 315.16,-168.11 334.84,-123.23
  rectangle: 309.25,-196.06 340.75,-175.98
  rectangle: 315.16,123.23 334.84,168.11
  rectangle: 309.25,175.98 340.75,196.06
  rectangle: 265.16,123.23 284.84,168.11
  rectangle: 259.25,175.98 290.75,196.06
  rectangle: 215.16,123.23 234.84,168.11
  rectangle: 209.25,175.98 240.75,196.06
  rectangle: 165.16,123.23 184.84,168.11
  rectangle: 159.25,175.98 190.75,196.06
  rectangle: 115.16,123.23 134.84,168.11
  rectangle: 109.25,175.98 140.75,196.06
  rectangle: 65.16,123.23 84.84,168.11
  rectangle: 59.25,175.98 90.75,196.06
  rectangle: 15.16,123.23 34.84,168.11
  rectangle: 9.25,175.98 40.75,196.06
  rectangle: -34.84,123.23 -15.16,168.11
  rectangle: -40.75,175.98 -9.25,196.06
  rectangle: -84.84,123.23 -65.16,168.11
  rectangle: -90.75,175.98 -59.25,196.06
  rectangle: -134.84,123.23 -115.16,168.11
  rectangle: -140.75,175.98 -109.25,196.06
  rectangle: -184.84,123.23 -165.16,168.11
  rectangle: -190.75,175.98 -159.25,196.06
  rectangle: -234.84,123.23 -215.16,168.11
  rectangle: -240.75,175.98 -209.25,196.06
  rectangle: -284.84,123.23 -265.16,168.11
  rectangle: -290.75,175.98 -259.25,196.06
  rectangle: -334.84,123.23 -315.16,168.11
  rectangle: -340.75,175.98 -309.25,196.06
  lines w8: -366.93,-172.05 366.54,-172.05 366.54,172.05 -366.93,172.05 -366.93,-172.05
Mechanical 27:
  lines w7.87: -370.08,-232.28 -370.08,232.28 370.08,232.28 370.08,-232.28 -370.08,-232.28

## SOJ28-45 [mil]
pads (28):
  rect 23.62x86.61 smd: 1(-325,-216.54) 2(-275,-216.54) 3(-225,-216.54) 4(-175,-216.54) 5(-125,-216.54) 6(-75,-216.54) 7(-25,-216.54) 8(25,-216.54) 9(75,-216.54) 10(125,-216.54) 11(175,-216.54) 12(225,-216.54) 13(275,-216.54) 14(325,-216.54) 15(325,216.54) 16(275,216.54) 17(225,216.54) 18(175,216.54) 19(125,216.54) 20(75,216.54) 21(25,216.54) 22(-25,216.54) 23(-75,216.54) 24(-125,216.54) 25(-175,216.54) 26(-225,216.54) 27(-275,216.54) 28(-325,216.54)
Top Overlay:
  text "1" at -303.54,-160.24 h77.5
Mechanical 16:
  rectangle: -334.84,-219.29 -315.16,-174.41
  rectangle: -340.75,-247.24 -309.25,-227.17
  rectangle: -284.84,-219.29 -265.16,-174.41
  rectangle: -290.75,-247.24 -259.25,-227.17
  rectangle: -234.84,-219.29 -215.16,-174.41
  rectangle: -240.75,-247.24 -209.25,-227.17
  rectangle: -184.84,-219.29 -165.16,-174.41
  rectangle: -190.75,-247.24 -159.25,-227.17
  rectangle: -134.84,-219.29 -115.16,-174.41
  rectangle: -140.75,-247.24 -109.25,-227.17
  rectangle: -84.84,-219.29 -65.16,-174.41
  rectangle: -90.75,-247.24 -59.25,-227.17
  rectangle: -34.84,-219.29 -15.16,-174.41
  rectangle: -40.75,-247.24 -9.25,-227.17
  rectangle: 15.16,-219.29 34.84,-174.41
  rectangle: 9.25,-247.24 40.75,-227.17
  rectangle: 65.16,-219.29 84.84,-174.41
  rectangle: 59.25,-247.24 90.75,-227.17
  rectangle: 115.16,-219.29 134.84,-174.41
  rectangle: 109.25,-247.24 140.75,-227.17
  rectangle: 165.16,-219.29 184.84,-174.41
  rectangle: 159.25,-247.24 190.75,-227.17
  rectangle: 215.16,-219.29 234.84,-174.41
  rectangle: 209.25,-247.24 240.75,-227.17
  rectangle: 265.16,-219.29 284.84,-174.41
  rectangle: 259.25,-247.24 290.75,-227.17
  rectangle: 315.16,-219.29 334.84,-174.41
  rectangle: 309.25,-247.24 340.75,-227.17
  rectangle: 315.16,174.41 334.84,219.29
  rectangle: 309.25,227.17 340.75,247.24
  rectangle: 265.16,174.41 284.84,219.29
  rectangle: 259.25,227.17 290.75,247.24
  rectangle: 215.16,174.41 234.84,219.29
  rectangle: 209.25,227.17 240.75,247.24
  rectangle: 165.16,174.41 184.84,219.29
  rectangle: 159.25,227.17 190.75,247.24
  rectangle: 115.16,174.41 134.84,219.29
  rectangle: 109.25,227.17 140.75,247.24
  rectangle: 65.16,174.41 84.84,219.29
  rectangle: 59.25,227.17 90.75,247.24
  rectangle: 15.16,174.41 34.84,219.29
  rectangle: 9.25,227.17 40.75,247.24
  rectangle: -34.84,174.41 -15.16,219.29
  rectangle: -40.75,227.17 -9.25,247.24
  rectangle: -84.84,174.41 -65.16,219.29
  rectangle: -90.75,227.17 -59.25,247.24
  rectangle: -134.84,174.41 -115.16,219.29
  rectangle: -140.75,227.17 -109.25,247.24
  rectangle: -184.84,174.41 -165.16,219.29
  rectangle: -190.75,227.17 -159.25,247.24
  rectangle: -234.84,174.41 -215.16,219.29
  rectangle: -240.75,227.17 -209.25,247.24
  rectangle: -284.84,174.41 -265.16,219.29
  rectangle: -290.75,227.17 -259.25,247.24
  rectangle: -334.84,174.41 -315.16,219.29
  rectangle: -340.75,227.17 -309.25,247.24
  lines w8: -366.93,-223.23 366.54,-223.23 366.54,223.23 -366.93,223.23 -366.93,-223.23
Mechanical 27:
  lines w7.87: -370.08,-271.65 -370.08,271.65 370.08,271.65 370.08,-271.65 -370.08,-271.65